# Altium footprint library common.PcbLib: 552 footprints (part 15 of 35)
Each footprint in its own frame and in the unit in brackets; x right, y up, seen from the top. Pads: shape width x height; smd on the part's side, far side on the other; paste and mask are expansions set on the pad; w line width, h text height; cw(c..) or ccw(c..) is an arc to the next point about the centre after c.
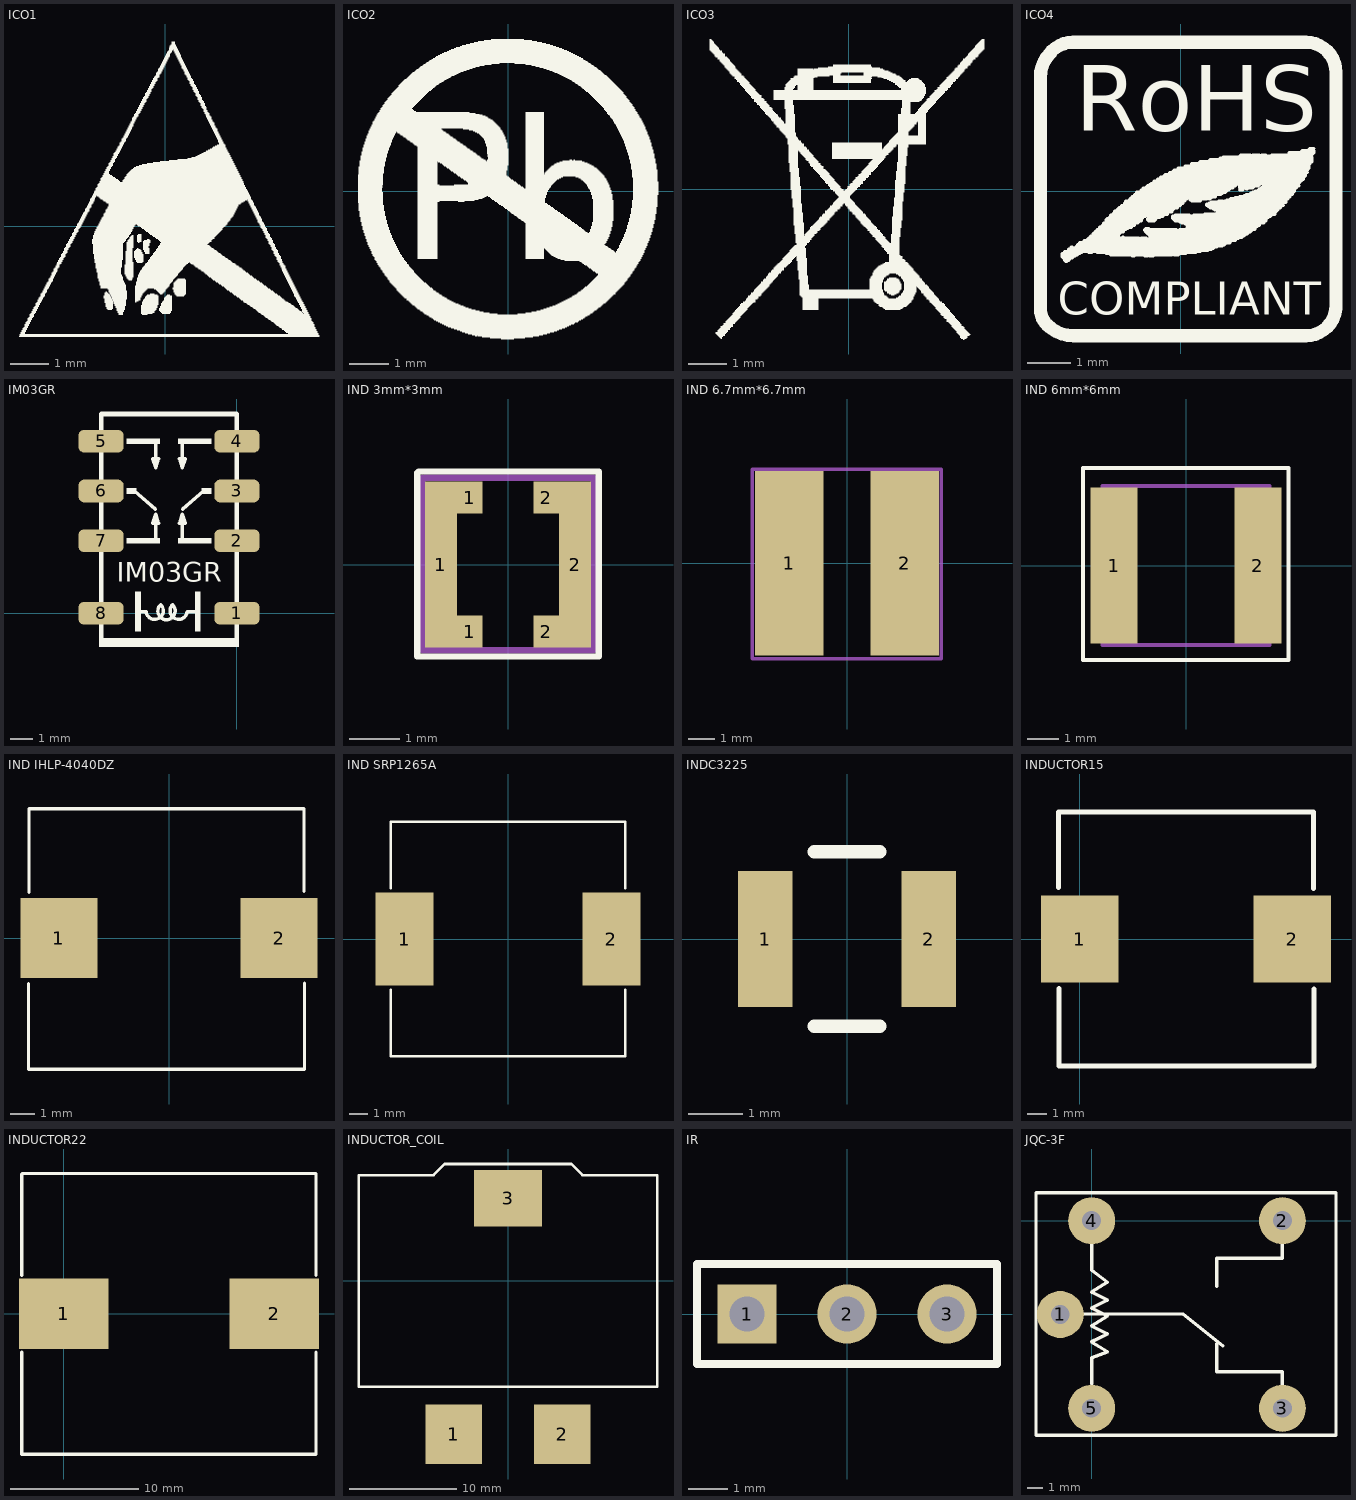
[diagram p14: the footprints below, top view; thin cyan lines are the x and y axes]

## ICO1 [mm]
Top Overlay:
  drawing of 990 lines, arcs and shapes, not listed

## ICO2 [mm]
Top Overlay:
  drawing of 960 lines, arcs and shapes, not listed

## ICO3 [mm]
Top Overlay:
  drawing of 1026 lines, arcs and shapes, not listed

## ICO4 [mm]
Top Overlay:
  drawing of 1541 lines, arcs and shapes, not listed
  text "COMPLIANT" at -2.845,-2.869 h0.76
  text "RoHS" at -2.438,1.398 h1.52

## IM03GR [mm]
pads (8):
  rrect50% 2x1 smd paste+0 mask+0: 1(0,0) 2(0,3.2) 3(0,5.4) 4(0,7.6) 5(-6,7.6) 6(-6,5.4) 7(-6,3.2) 8(-6,0)
Top Overlay:
  region: 0.1,-1.5 0.1,-1.2 -6.1,-1.2 -6.1,-1.5
  region: -3.387,3.074 -3.387,3.328 -4.876,3.328 -4.876,3.074
  region: -4.876,7.726 -4.876,7.472 -3.387,7.472 -3.387,7.726
  region: -4.879,5.526 -4.879,5.272 -4.43,5.272 -4.43,5.526
  region: -1.571,5.524 -1.571,5.27 -1.123,5.27 -1.123,5.524
  region: -2.613,7.726 -2.613,7.472 -1.124,7.472 -1.124,7.726
  region: -1.124,3.074 -1.124,3.328 -2.613,3.328 -2.613,3.074
  region: -1.604,0.953 -1.858,0.953 -1.858,-0.8 -1.604,-0.8
  rectangle: -4.5,-0.8 -4.246,0.953
  lines w0.152: -4.543,5.412 -3.6,4.6 ; -4.424,0.063 -4.017,0.063 ; -4.011,0.07 ccw(c-3.632,0.112) -3.363,0.381 ccw(c-3.11,0.096) -2.841,0.365 ; -3.587,3.302 -3.587,4.364 ; -3.587,7.498 -3.587,6.436 ; -2.843,0.381 ccw(c-2.574,0.112) -2.195,0.07 ; -2.413,3.302 -2.413,4.364 ; -2.413,7.498 -2.413,6.436 ; -2.4,4.6 -1.457,5.412 ; -2.189,0.063 -1.782,0.063 ; -3.587,4.364 -3.46,3.983 -3.714,3.983 -3.587,4.364 ; -3.587,6.436 -3.714,6.817 -3.46,6.817 -3.587,6.436 ; -2.413,4.364 -2.286,3.983 -2.54,3.983 -2.413,4.364 ; -2.413,6.436 -2.54,6.817 -2.286,6.817 -2.413,6.436
  lines w0.203: -6,-0.5 -6,-1.2 -3,-1.2 0,-1.2 0,-0.5 ; -6,0.5 -6,2.7 ; -6,3.7 -6,4.9 ; -6,5.9 -6,7.1 ; -6,8.1 -6,8.8 -3,8.8 0,8.8 0,8.1 ; 0,0.5 0,2.7 ; 0,3.7 0,4.9 ; 0,5.9 0,7.1
  text "IM03GR" at -5.3,1.4 h0.86
3D body: height 3.8, standoff 0, extent -5.969,-1.016 -0.127,8.636
3D body: height 0.14, standoff 0, extent -6.682,7.473 -5.855,7.79
3D body: height 0.14, standoff 0, extent -0.136,7.443 0.691,7.76
3D body: height 0.14, standoff 0, extent -0.159,5.23 0.668,5.547
3D body: height 0.14, standoff 0, extent -0.128,3.056 0.699,3.373
3D body: height 0.14, standoff 0, extent -0.136,-0.169 0.691,0.148
3D body: height 0.14, standoff 0, extent -6.705,5.268 -5.878,5.585
3D body: height 0.14, standoff 0, extent -6.729,3.047 -5.902,3.364
3D body: height 0.14, standoff 0, extent -6.791,-0.132 -5.964,0.185

## IND 3mm*3mm [mil] "INDUCTOR 2.2UH"
pads (6):
  rect 25x130 smd: 1(-52.5,0) 2(52.5,0)
  rect 20x25 smd: 1(-30,-52.5) 1(-30,52.5) 2(30,-52.5) 2(30,52.5)
Top Overlay:
  lines w5: 71,72 71,-72 -71,-72 -71,72 -70,73 71,73
Mechanical 2:
  lines w5: -67,68 -67,-67 67,-67 67,68 -65,68
  text ".Designator" at -58,-8 h20
3D body: height -15.75, standoff -74.8, extent -61.73,-61.65 62.52,62.6

## IND 6.7mm*6.7mm [mm] "POWER INDUCTOR 5uH"
pads (2):
  rect 2.6x7 smd: 1(-2.2,0) 2(2.2,0)
Mechanical 2:
  lines w0.127: -3.607,3.581 -3.607,-3.632 3.581,-3.632 3.581,3.581 -3.556,3.581
  text ".Designator" at -3.124,-0.33 h0.76
3D body: height 4.1, standoff 0, extent -3.36,-3.33 3.44,3.47

## IND 6mm*6mm [mm] "6 MM SERIES"
pads (2):
  rect 1.5x5 smd: 1(-2.3,0) 2(2.3,0)
Top Overlay:
  lines w0.127: -3.302,-3.023 -3.302,3.124 3.277,3.124 3.277,-3.023 -3.302,-3.023
Mechanical 2:
  lines w0.127: -2.667,-2.54 -2.667,2.54 2.667,2.54 2.667,-2.54 -2.667,-2.54
  text ".Designator" at -2.286,-0.254 h0.76
3D body: height 4, standoff 0, extent -2.5,-2.54 2.5,2.46

## IND IHLP-4040DZ [mm] "IHLP-4040DZ-8A"
pads (2):
  rect 3.124x3.251 smd: 1(-4.471,0) 2(4.471,0)
Top Overlay:
  lines w0.127: -5.715,-1.854 -5.715,-5.334 5.512,-5.334 5.512,-1.829 ; -5.69,1.854 -5.69,5.258 5.486,5.258 5.486,1.905
3D body: height 4, standoff 0, extent -5.561,-5.175 5.359,5.125

## IND SRP1265A [mm] "SRP1265A 220M"
pads (2):
  rect 3.1x5 smd: 1(-5.55,0) 2(5.55,0)
Top Overlay:
  lines w0.127: -6.3,-6.3 6.3,-6.3 ; -6.3,6.3 6.3,6.3 ; -6.299,-6.299 -6.299,-2.718 ; -6.299,2.718 -6.299,6.299 ; 6.299,-6.299 6.299,-2.718 ; 6.299,2.718 6.299,6.299
3D body: height 7, standoff 0, extent -6.833,-6.821 6.867,6.872

## INDC3225 [mm]
pads (2):
  rect 1x2.5 smd: 1(-1.5,0) 2(1.5,0)
Top Overlay:
  lines w0.254: -0.6,-1.6 0.6,-1.6 ; -0.6,1.6 0.6,1.6
3D body: height 0.89, standoff 0.76, extent -0.825,-0.83 0.949,0.944
3D body: height 0.76, standoff 0.51, extent -0.719,-0.754 0.799,0.764
3D body: height 0.64, standoff 0, extent -0.85,-0.831 0.961,0.979
3D body: height 1.02, standoff 0.89, extent -0.763,-0.627 0.754,0.891
3D body: height 1.14, standoff 1.02, extent -0.71,-0.815 1.064,0.959
3D body: height 1.27, standoff 1.14, extent -0.945,-0.786 0.875,1.026
3D body: height 0.51, standoff 0, extent -1.252,-1.136 1.288,1.15
3D body: height 1.78, standoff 1.27, extent -1.252,-1.136 1.288,1.15
3D body: height 1.78, standoff 0, extent 0.831,0.87 1.275,1.124
3D body: height 1.78, standoff 0, extent 0.831,-1.111 1.275,-0.857
3D body: height 1.78, standoff 0, extent -1.227,0.87 -0.782,1.124
3D body: height 1.78, standoff 0, extent -1.227,-1.111 -0.782,-0.857
3D body: height 0.38, standoff 0, extent 1.288,-0.374 1.415,0.388
3D body: height 0.38, standoff 0, extent -1.379,-0.311 -1.252,0.451
3D body: height 0.64, standoff 0, extent 0.713,-0.401 1.415,0.134
3D body: height 0.64, standoff 0, extent -1.316,0.134 -0.674,0.667

## INDUCTOR15 [mm]
pads (2):
  rect 4x4.5 smd: 1(0,0) 2(11,0)
Top Overlay:
  lines w0.254: -1.092,2.667 -1.092,6.553 12.09,6.553 12.09,2.616 ; -1.067,-2.565 -1.067,-6.553 12.116,-6.553 12.116,-2.591
3D body: height 3.5, standoff -3.5, extent -1.432,-6.897 12.268,6.796

## INDUCTOR22 [mm]
pads (2):
  rect 7x5.5 smd: 1(0,0) 2(16.5,0)
Top Overlay:
  lines w0.254: -3.277,-11 19.761,-11 ; -3.277,-10.998 -3.277,-3 ; -3.277,3 -3.277,10.947 -3.224,11 19.761,11 ; 19.761,-11.024 19.761,-3 ; 19.761,3 19.761,10.998
3D body: height 12, standoff -0.13, extent -3.47,-10.922 20.03,11.078

## INDUCTOR_COIL [mil] "SER2918H-XXXXH"
pads (3):
  rect 210x220 smd: 1(-200,-565) 2(200,-565)
  rect 250x208 smd: 3(0,304)
Top Overlay:
  lines w10: -550,-390 550,-390 550,390 275,390 234,431 -234,431 -275,390 -550,390 -550,-390
3D body: height 698.27, standoff -1.73, extent -548,-661 550.5,439

## IR [mm]
pads (3):
  rect 1.5x1.5 hole 0.9: 1(-2.54,0)
  round 1.5 hole 0.9: 2(0,0) 3(2.54,0)
Top Overlay:
  lines w0.2: -3.81,-1.27 3.81,-1.27 3.81,1.27 -3.81,1.27 -3.81,-1.27
3D body: height 10.48, standoff -2.63, extent -3.025,-3.997 2.975,3.789

## JQC-3F [mm]
pads (5):
  round 3 hole 1.2: 1(-2,-6) 2(12.2,0) 3(12.2,-12) 4(0,0) 5(0,-12)
Top Overlay:
  lines w0.22: -0.508,-5.969 5.842,-5.969 8.382,-8.001 ; 0,-10.414 0,-8.763 1.016,-8.382 0,-7.747 1.016,-7.239 0,-6.731 1.016,-6.096 0,-5.588 1.016,-5.08 0,-4.572 1.016,-3.937 0,-3.175 0,-1.524 ; 8.001,-7.874 8.001,-9.652 12.192,-9.652 12.192,-10.541 ; 8.001,-4.191 8.001,-2.413 12.192,-2.413 12.192,-1.524 ; -3.556,-13.716 15.621,-13.716 15.621,1.778 -3.556,1.778 -3.556,-13.716
3D body: height 15.3, standoff -5, extent -3.454,-13.722 15.646,1.778